# Altium footprint library North POLE.PcbLib: 419 footprints (part 27 of 27)
Each footprint in its own frame and in the unit in brackets; x right, y up, seen from the top. Pads: shape width x height; smd on the part's side, far side on the other; paste and mask are expansions set on the pad; w line width, h text height; cw(c..) or ccw(c..) is an arc to the next point about the centre after c.
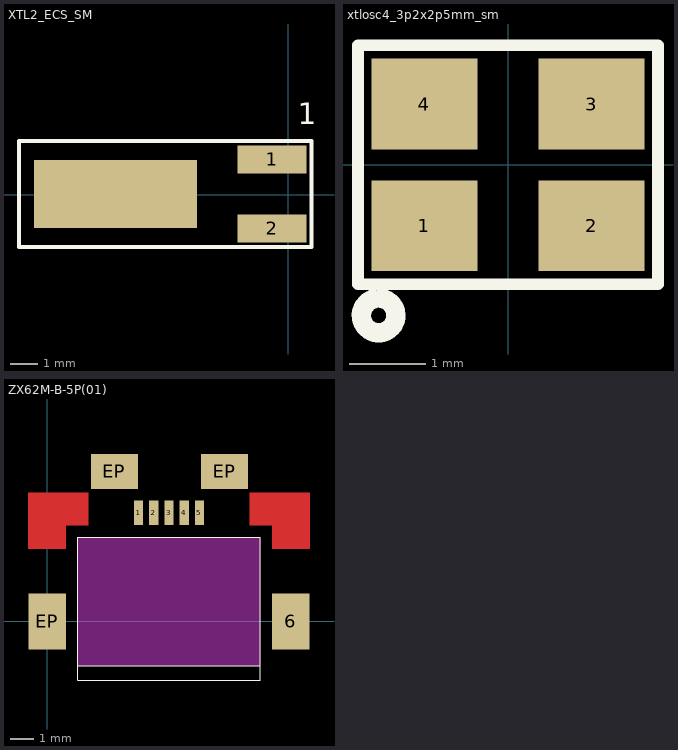
[diagram p26: the footprints below, top view; thin cyan lines are the x and y axes]

## XTL2_ECS_SM [mil]
pads (3):
  rect 100x40 smd: 1(-23,51) 2(-23,-49)
  rect 236x98 smd: " "(-250,1)
Top Overlay:
  lines w6: -390,-76 34,-76 34,78 -390,78 -390,-76
  text "1" at 13.78,102.36 h31

## xtlosc4_3p2x2p5mm_sm [mil]
pads (4):
  rect 55x47 smd: 1(-43.31,-31.5) 2(43.31,-31.5) 3(43.31,31.5) 4(-43.31,31.5)
Top Overlay:
  lines w6: -77.68,-61.93 77.68,-61.93 77.68,61.93 -77.68,61.93 -77.68,-61.93
  lines w10: -70.02,-69.58 ccw(c-67,-78) -65.45,-69.19

## ZX62M-B-5P(01) [mm] "mid mount usb"
pads (9):
  rect 0.4x1.05 smd: 1(3.9,4.63) 2(4.55,4.63) 3(5.2,4.63) 4(5.85,4.63) 5(6.5,4.63)
  rect 1.6x2.4 smd: 6(10.4,0) EP(0,0)
  rect 2x1.5 smd: EP(2.87,6.4) EP(7.57,6.4)
Top Layer:
  region: -0.8,3.1 0.8,3.1 0.8,4.1 1.75,4.1 1.75,5.5 -0.8,5.5
  region: 11.2,3.1 11.2,5.5 8.65,5.5 8.65,4.1 9.6,4.1 9.6,3.1
Top Overlay:
  lines w0.01: 9.1,-1.9 1.3,-1.9 1.3,-2.5 ; 1.3,-2.5 1.3,3.6 9.1,3.6 9.1,-2.5 1.3,-2.5
Keep-Out Layer:
  board cut-out: 1.3,-1.9 1.3,3.6 9.1,3.6 9.1,-1.9
3D body: height 1.54, standoff -1.54, extent -0.55,-2.5 10.95,6.795